# Altium footprint library hphonglib.PcbLib: 1250 footprints (part 55 of 79) (continued)
## QFP64E-Pitch_0.5mm [mm] "64-Pin Thin Quad Flat Pack 10x10x1mm body, 0.5 mm Pitch, IPC High Density" (continued)
Top Overlay:
  circle w0.25: c-5.525,4.425 r0.125
  lines w0.2: -6.4,-6.4 6.4,-6.4 6.4,6.4 -4.395,6.4 -6.4,4.395 -6.4,-6.4
  lines w0.203: -16.51,-16.51 16.51,-16.51 16.51,16.51 -16.51,16.51 -16.51,-16.51
  text "1" at -11.43,10.16 h1.02
  text "17" at -10.16,-12.065 h1.02
  text "33" at 12.065,-10.16 h1.02
  text "49" at 10.16,12.065 h1.02
Mechanical 13:
  circle w0.1: c-4.1,4.1 r0.5
  lines w0.1: -5,-5 -5,5 5,5 5,-5 -5,-5
Mechanical 15:
  lines w0.1: -0.5,0 0.5,0 ; 0,-0.5 0,0.5 ; -6.4,-6.4 6.4,-6.4 6.4,6.4 -6.4,6.4 -6.4,-6.4
3D body: height 1.6, standoff 0, extent -5,-5 5,5

## QFP80.MSP430FG439 [mm] "80-Pin Thin Quad Flat Pack 0.5 mm Pitch, IPC Low Density"
pads (80):
  rect 1.2x0.25 smd: 1(0,0)
  oval 1.2x0.25 smd: 2(0,-0.5) 3(0,-1) 4(0,-1.5) 5(0,-2) 6(0,-2.5) 7(0,-3) 8(0,-3.5) 9(0,-4) 10(0,-4.5) 11(0,-5) 12(0,-5.5) 13(0,-6) 14(0,-6.5) 15(0,-7) 16(0,-7.5) 17(0,-8) 18(0,-8.5) 19(0,-9) 20(0,-9.5) 41(14,-9.5) 42(14,-9) 43(14,-8.5) 44(14,-8) 45(14,-7.5) 46(14,-7) 47(14,-6.5) 48(14,-6) 49(14,-5.5) 50(14,-5) 51(14,-4.5) 52(14,-4) 53(14,-3.5) 54(14,-3) 55(14,-2.5) 56(14,-2) 57(14,-1.5) 58(14,-1) 59(14,-0.5) 60(14,0)
  oval 0.25x1.2 smd: 21(2.25,-11.75) 22(2.75,-11.75) 23(3.25,-11.75) 24(3.75,-11.75) 25(4.25,-11.75) 26(4.75,-11.75) 27(5.25,-11.75) 28(5.75,-11.75) 29(6.25,-11.75) 30(6.75,-11.75) 31(7.25,-11.75) 32(7.75,-11.75) 33(8.25,-11.75) 34(8.75,-11.75) 35(9.25,-11.75) 36(9.75,-11.75) 37(10.25,-11.75) 38(10.75,-11.75) 39(11.25,-11.75) 40(11.75,-11.75) 61(11.75,2.25) 62(11.25,2.25) 63(10.75,2.25) 64(10.25,2.25) 65(9.75,2.25) 66(9.25,2.25) 67(8.75,2.25) 68(8.25,2.25) 69(7.75,2.25) 70(7.25,2.25) 71(6.75,2.25) 72(6.25,2.25) 73(5.75,2.25) 74(5.25,2.25) 75(4.75,2.25) 76(4.25,2.25) 77(3.75,2.25) 78(3.25,2.25) 79(2.75,2.25) 80(2.25,2.25)
Top Overlay:
  lines w0.2: 1.135,-10.615 12.865,-10.615 12.865,1.115 2.27,1.115 1.135,-0.02 1.135,-10.615
Mechanical 13:
  lines w0.2: -0.75,-12.5 -0.75,3 14.75,3 14.75,-12.5 -0.75,-12.5
  text ".Designator" at 3.531,-5.182 h2.03
3D body: height 1.57, standoff 1.55, extent 7.674,-3.58 8.174,-3.08
3D body: height 1.57, standoff 1.55, extent 7.25,-5.775 8.135,-3.813
3D body: height 1.57, standoff 1.55, extent 3.8,-7.588 9.95,-2.1
3D body: height 0.2, standoff 0, extent 0,-0.125 1.025,0.125
3D body: height 1.55, standoff 0.1, extent 1,-10.737 13,1.262
3D body: height 0.2, standoff 0, extent 0,-0.625 1.025,-0.375
3D body: height 0.2, standoff 0, extent 0,-1.125 1.025,-0.875
3D body: height 0.2, standoff 0, extent 0,-1.625 1.025,-1.375
3D body: height 0.2, standoff 0, extent 0,-2.125 1.025,-1.875
3D body: height 0.2, standoff 0, extent 0,-2.625 1.025,-2.375
3D body: height 0.2, standoff 0, extent 0,-3.125 1.025,-2.875
3D body: height 0.2, standoff 0, extent 0,-3.625 1.025,-3.375
3D body: height 0.2, standoff 0, extent 0,-4.125 1.025,-3.875
3D body: height 0.2, standoff 0, extent 0,-4.625 1.025,-4.375
3D body: height 0.2, standoff 0, extent 0,-5.15 1.025,-4.9
3D body: height 0.2, standoff 0, extent 0,-5.625 1.025,-5.375
3D body: height 0.2, standoff 0, extent 0,-6.125 1.025,-5.875
3D body: height 0.2, standoff 0, extent 0,-6.625 1.025,-6.375
3D body: height 0.2, standoff 0, extent 0,-7.125 1.025,-6.875
3D body: height 0.2, standoff 0, extent 0,-7.625 1.025,-7.375
3D body: height 0.2, standoff 0, extent 0,-8.125 1.025,-7.875
3D body: height 0.2, standoff 0, extent 0,-8.625 1.025,-8.375
3D body: height 0.2, standoff 0, extent 0,-9.125 1.025,-8.875
3D body: height 0.2, standoff 0, extent 0,-9.625 1.025,-9.375
3D body: height 0.2, standoff 0, extent 12.975,-9.625 14,-9.375
3D body: height 0.2, standoff 0, extent 12.975,-9.125 14,-8.875
3D body: height 0.2, standoff 0, extent 12.975,-8.625 14,-8.375
3D body: height 0.2, standoff 0, extent 12.975,-8.125 14,-7.875
3D body: height 0.2, standoff 0, extent 12.975,-7.625 14,-7.375
3D body: height 0.2, standoff 0, extent 12.975,-7.125 14,-6.875
3D body: height 0.2, standoff 0, extent 12.975,-6.625 14,-6.375
3D body: height 0.2, standoff 0, extent 12.975,-6.125 14,-5.875
3D body: height 0.2, standoff 0, extent 12.975,-5.625 14,-5.375
3D body: height 0.2, standoff 0, extent 12.975,-5.125 14,-4.875
3D body: height 0.2, standoff 0, extent 12.975,-4.625 14,-4.375
3D body: height 0.2, standoff 0, extent 12.975,-4.125 14,-3.875
3D body: height 0.2, standoff 0, extent 12.975,-3.625 14,-3.375
3D body: height 0.2, standoff 0, extent 12.975,-3.125 14,-2.875
3D body: height 0.2, standoff 0, extent 12.975,-2.625 14,-2.375
3D body: height 0.2, standoff 0, extent 12.975,-2.125 14,-1.875
3D body: height 0.2, standoff 0, extent 12.975,-1.625 14,-1.375
3D body: height 0.2, standoff 0, extent 12.975,-1.125 14,-0.875
3D body: height 0.2, standoff 0, extent 12.975,-0.625 14,-0.375
3D body: height 0.2, standoff 0, extent 12.975,-0.125 14,0.125
3D body: height 0.2, standoff 0, extent 11.625,1.225 11.875,2.25
3D body: height 0.2, standoff 0, extent 11.125,1.225 11.375,2.25
3D body: height 0.2, standoff 0, extent 10.625,1.225 10.875,2.25
3D body: height 0.2, standoff 0, extent 10.125,1.225 10.375,2.25
3D body: height 0.2, standoff 0, extent 9.625,1.225 9.875,2.25
3D body: height 0.2, standoff 0, extent 9.125,1.225 9.375,2.25
3D body: height 0.2, standoff 0, extent 8.625,1.225 8.875,2.25
3D body: height 0.2, standoff 0, extent 8.125,1.225 8.375,2.25
3D body: height 0.2, standoff 0, extent 7.625,1.225 7.875,2.25
3D body: height 0.2, standoff 0, extent 7.125,1.225 7.375,2.25
3D body: height 0.2, standoff 0, extent 6.625,1.225 6.875,2.25
3D body: height 0.2, standoff 0, extent 6.125,1.225 6.375,2.25
3D body: height 0.2, standoff 0, extent 5.625,1.225 5.875,2.25
3D body: height 0.2, standoff 0, extent 5.125,1.225 5.375,2.25
3D body: height 0.2, standoff 0, extent 4.625,1.225 4.875,2.25
3D body: height 0.2, standoff 0, extent 4.125,1.225 4.375,2.25
3D body: height 0.2, standoff 0, extent 3.625,1.225 3.875,2.25
3D body: height 0.2, standoff 0, extent 3.125,1.225 3.375,2.25
3D body: height 0.2, standoff 0, extent 2.625,1.225 2.875,2.25
3D body: height 0.2, standoff 0, extent 2.125,1.225 2.375,2.25
3D body: height 0.2, standoff 0, extent 2.125,-11.75 2.375,-10.725
3D body: height 0.2, standoff 0, extent 2.625,-11.75 2.875,-10.725
3D body: height 0.2, standoff 0, extent 3.125,-11.75 3.375,-10.725
3D body: height 0.2, standoff 0, extent 3.625,-11.75 3.875,-10.725
3D body: height 0.2, standoff 0, extent 4.125,-11.75 4.375,-10.725
3D body: height 0.2, standoff 0, extent 4.625,-11.75 4.875,-10.725
3D body: height 0.2, standoff 0, extent 5.125,-11.75 5.375,-10.725
3D body: height 0.2, standoff 0, extent 5.625,-11.75 5.875,-10.725
3D body: height 0.2, standoff 0, extent 6.125,-11.75 6.375,-10.725
3D body: height 0.2, standoff 0, extent 6.625,-11.75 6.875,-10.725
3D body: height 0.2, standoff 0, extent 7.125,-11.75 7.375,-10.725
3D body: height 0.2, standoff 0, extent 7.625,-11.75 7.875,-10.725
3D body: height 0.2, standoff 0, extent 8.125,-11.75 8.375,-10.725
3D body: height 0.2, standoff 0, extent 8.625,-11.75 8.875,-10.725
3D body: height 0.2, standoff 0, extent 9.125,-11.75 9.375,-10.725
3D body: height 0.2, standoff 0, extent 9.625,-11.75 9.875,-10.725
3D body: height 0.2, standoff 0, extent 10.125,-11.75 10.375,-10.725
3D body: height 0.2, standoff 0, extent 10.625,-11.75 10.875,-10.725
3D body: height 0.2, standoff 0, extent 11.125,-11.75 11.375,-10.725
3D body: height 0.2, standoff 0, extent 11.625,-11.75 11.875,-10.725
3D body: height 1.57, standoff 1.55, extent 1.35,-0.1 2.35,0.9

## QFP80EN [mm] "80-Pin Thin Quad Flat Pack 0.5 mm Pitch, 12x12x1mm Body"
pads (164):
  round 5 hole 3: 0(16.51,16.51) 1(16.51,-16.51) 2(-16.51,-16.51) 3(-16.51,16.51)
  rect 1.5x1.5 hole 0.9: 1(-13.97,11.43) 21(-11.43,-13.97) 41(13.97,-11.43) 61(11.43,13.97)
  rect 1.2x0.25 smd: 1(-7,4.75)
  round 1.5 hole 0.9: 2(-16.51,11.43) 3(-13.97,8.89) 4(-16.51,8.89) 5(-13.97,6.35) 6(-16.51,6.35) 7(-13.97,3.81) 8(-16.51,3.81) 9(-13.97,1.27) 10(-16.51,1.27) 11(-13.97,-1.27) 12(-16.51,-1.27) 13(-13.97,-3.81) 14(-16.51,-3.81) 15(-13.97,-6.35) 16(-16.51,-6.35) 17(-13.97,-8.81) 18(-16.51,-8.81) 19(-13.97,-11.43) 20(-16.51,-11.43) 22(-11.43,-16.51) 23(-8.89,-13.97) 24(-8.89,-16.51) 25(-6.35,-13.97) 26(-6.35,-16.51) 27(-3.81,-13.97) 28(-3.81,-16.51) 29(-1.27,-13.97) 30(-1.27,-16.51) 31(1.27,-13.97) 32(1.27,-16.51) 33(3.81,-13.97) 34(3.81,-16.51) 35(6.35,-13.97) 36(6.35,-16.51) 37(8.81,-13.97) 38(8.81,-16.51) 39(11.43,-13.97) 40(11.43,-16.51) 42(16.51,-11.43) 43(13.97,-8.89) 44(16.51,-8.89) 45(13.97,-6.35) 46(16.51,-6.35) 47(13.97,-3.81) 48(16.51,-3.81) 49(13.97,-1.27) 50(16.51,-1.27) 51(13.97,1.27) 52(16.51,1.27) 53(13.97,3.81) 54(16.51,3.81) 55(13.97,6.35) 56(16.51,6.35) 57(13.97,8.81) 58(16.51,8.81) 59(13.97,11.43) 60(16.51,11.43) 62(11.43,16.51) 63(8.89,13.97) 64(8.89,16.51) 65(6.35,13.97) 66(6.35,16.51) 67(3.81,13.97) 68(3.81,16.51) 69(1.27,13.97) 70(1.27,16.51) 71(-1.27,13.97) 72(-1.27,16.51) 73(-3.81,13.97) 74(-3.81,16.51) 75(-6.35,13.97) 76(-6.35,16.51) 77(-8.81,13.97) 78(-8.81,16.51) 79(-11.43,13.97) 80(-11.43,16.51)
  oval 1.2x0.25 smd: 2(-7,4.25) 3(-7,3.75) 4(-7,3.25) 5(-7,2.75) 6(-7,2.25) 7(-7,1.75) 8(-7,1.25) 9(-7,0.75) 10(-7,0.25) 11(-7,-0.25) 12(-7,-0.75) 13(-7,-1.25) 14(-7,-1.75) 15(-7,-2.25) 16(-7,-2.75) 17(-7,-3.25) 18(-7,-3.75) 19(-7,-4.25) 20(-7,-4.75) 41(7,-4.75) 42(7,-4.25) 43(7,-3.75) 44(7,-3.25) 45(7,-2.75) 46(7,-2.25) 47(7,-1.75) 48(7,-1.25) 49(7,-0.75) 50(7,-0.25) 51(7,0.25) 52(7,0.75) 53(7,1.25) 54(7,1.75) 55(7,2.25) 56(7,2.75) 57(7,3.25) 58(7,3.75) 59(7,4.25) 60(7,4.75)
  oval 0.25x1.2 smd: 21(-4.75,-7) 22(-4.25,-7) 23(-3.75,-7) 24(-3.25,-7) 25(-2.75,-7) 26(-2.25,-7) 27(-1.75,-7) 28(-1.25,-7) 29(-0.75,-7) 30(-0.25,-7) 31(0.25,-7) 32(0.75,-7) 33(1.25,-7) 34(1.75,-7) 35(2.25,-7) 36(2.75,-7) 37(3.25,-7) 38(3.75,-7) 39(4.25,-7) 40(4.75,-7) 61(4.75,7) 62(4.25,7) 63(3.75,7) 64(3.25,7) 65(2.75,7) 66(2.25,7) 67(1.75,7) 68(1.25,7) 69(0.75,7) 70(0.25,7) 71(-0.25,7) 72(-0.75,7) 73(-1.25,7) 74(-1.75,7) 75(-2.25,7) 76(-2.75,7) 77(-3.25,7) 78(-3.75,7) 79(-4.25,7) 80(-4.75,7)
Top Layer:
  lines w0.254: -16.51,-11.43 -14.986,-12.954 -13.462,-12.954 -8.636,-8.128 -8.636,-5.842 -7.544,-4.75 -7,-4.75 ; -16.51,-8.81 -15.16,-10.16 -13.081,-10.16 -9.906,-6.985 -9.906,-5.08 -8.576,-3.75 -7,-3.75 -7.56,-3.75 ; -16.51,-6.35 -15.24,-7.62 -12.827,-7.62 -11.176,-5.969 -11.176,-4.445 -9.481,-2.75 -9.271,-2.75 -7,-2.75 ; -16.51,-3.81 -15.24,-5.08 -13.208,-5.08 -12.954,-5.08 -12.446,-4.572 -12.446,-3.683 -10.513,-1.75 -9.878,-1.75 -7,-1.75 ; -16.51,-1.27 -15.24,-2.54 -13.335,-2.54 -11.545,-0.75 -7,-0.75 ; -16.51,1.27 -15.24,0 -12.954,0 -12.704,0.25 -7,0.25 ; -16.51,3.81 -15.24,2.54 -13.081,2.54 -11.791,1.25 -7,1.25 ; -16.51,6.35 -15.24,5.08 -13.335,5.08 -10.505,2.25 -7,2.25 ; -16.51,8.89 -15.24,7.62 -13.081,7.62 -11.811,6.35 -11.811,5.588 -9.473,3.25 -7,3.25 ; -16.51,11.43 -15.24,10.16 -12.954,10.16 -10.287,7.493 -10.287,6.35 -8.187,4.25 -7,4.25 ; -13.97,-11.43 -13.208,-11.43 -9.271,-7.493 -9.271,-5.461 -8.06,-4.25 -7,-4.25 ; -13.97,-8.81 -13.001,-8.81 -10.541,-6.35 -10.541,-4.826 -8.965,-3.25 -8.838,-3.25 -7,-3.25 ; -13.97,-6.35 -12.827,-6.35 -11.811,-5.334 -11.811,-4.064 -9.997,-2.25 -9.743,-2.25 -7,-2.25 ; -13.97,-3.81 -13.589,-3.81 -11.029,-1.25 -7,-1.25 ; -13.97,-1.27 -13.081,-1.27 -12.061,-0.25 -7,-0.25 ; -13.97,1.27 -13.45,0.75 -7,0.75 ; -13.97,3.81 -13.081,3.81 -11.021,1.75 -7,1.75 ; -13.97,6.35 -12.954,6.35 -12.446,5.842 -12.446,5.207 -9.989,2.75 -7,2.75 ; -13.97,8.89 -12.954,8.89 -11.049,6.985 -11.049,5.969 -8.83,3.75 -7,3.75 ; -13.97,11.43 -12.954,11.43 -9.652,8.128 -9.652,6.604 -7.798,4.75 -7,4.75 ; -11.43,-16.51 -10.16,-15.24 -10.16,-12.954 -6.985,-9.779 -5.334,-9.779 -4.25,-8.695 -4.25,-7 ; -11.43,-13.97 -11.43,-13.208 -7.112,-8.89 -5.385,-8.89 -4.75,-8.255 -4.75,-7 ; -11.43,13.97 -11.43,13.081 -7.874,9.525 -5.461,9.525 -4.25,8.314 -4.25,7 ; -11.43,16.51 -12.7,15.24 -12.7,13.208 -9.652,10.16 -8.382,8.89 -5.639,8.89 -4.75,8.001 -4.75,7 ; -8.89,-16.51 -7.62,-15.24 -7.62,-12.573 -6.477,-11.43 -5.08,-11.43 -3.25,-9.6 -3.25,-7 ; -8.89,-13.97 -8.89,-12.7 -6.731,-10.541 -5.207,-10.541 -3.75,-9.084 -3.75,-7 ; -8.81,13.97 -8.81,12.62 -8.255,12.065 -6.86,10.67 -5.082,10.67 -3.25,8.838 -3.25,7 ; -8.81,16.51 -10.16,15.16 -10.16,12.954 -7.366,10.16 -5.334,10.16 -3.75,8.576 -3.75,7 ; -6.35,-16.51 -5.08,-15.24 -5.08,-13.208 -2.25,-10.378 -2.25,-7 ; -6.35,-13.97 -6.35,-12.7 -5.715,-12.065 -4.826,-12.065 -2.75,-9.989 -2.75,-7 ; -6.35,13.97 -6.35,12.446 -5.842,11.938 -4.572,11.938 -2.25,9.616 -2.25,7 ; -6.35,16.51 -7.62,15.24 -7.62,12.573 -6.35,11.303 -4.826,11.303 -2.75,9.227 -2.75,7 ; -3.81,-16.51 -2.54,-15.24 -2.54,-12.827 -1.25,-11.537 -1.25,-7 ; -3.81,-13.97 -3.81,-12.954 -1.75,-10.894 -1.75,-7 ; -3.81,13.97 -3.81,12.954 -1.25,10.394 -1.25,7 ; -3.81,16.51 -5.08,15.24 -5.08,13.081 -4.572,12.573 -4.318,12.573 -1.75,10.005 -1.75,7 ; -1.27,-16.51 0,-15.24 0,-12.065 -0.25,-11.815 -0.25,-7 ; -1.27,-13.97 -0.75,-13.45 -0.75,-7 ; -1.27,13.97 -1.27,12.192 -0.25,11.172 -0.25,7 ; -1.27,16.51 -2.54,15.24 -2.54,12.573 -0.75,10.783 -0.75,7 ; 0.25,-7 0.25,-11.299 1.27,-12.319 1.27,-13.97 ; 0.25,7 0.25,11.815 0,12.065 0,15.24 1.27,16.51 ; 0.75,-7 0.75,-10.91 2.54,-12.7 2.54,-15.24 1.27,-16.51 ; 0.75,7 0.75,12.434 1.27,12.954 1.27,13.97 ; 1.25,-7 1.25,-10.521 3.81,-13.081 3.81,-13.97 ; 1.25,7 1.25,11.791 2.54,13.081 2.54,15.24 3.81,16.51 ; 1.75,-7 1.75,-10.132 5.08,-13.462 5.08,-15.24 3.81,-16.51 ; 1.75,7 1.75,11.275 3.81,13.335 3.81,13.97 ; 2.25,-7 2.25,-9.616 6.35,-13.716 6.35,-13.97 ; 2.25,7 2.25,10.886 3.429,12.065 4.318,12.065 5.08,12.827 5.08,15.24 6.35,16.51 ; 2.75,-7 2.75,-9.227 5.653,-12.13 6.923,-12.13 7.62,-12.827 7.62,-15.24 6.35,-16.51 ; 2.75,7 2.75,10.37 3.81,11.43 4.572,11.43 6.35,13.208 6.35,13.97 ; 3.25,-7 3.25,-8.838 5.715,-11.303 7.366,-11.303 8.81,-12.747 8.81,-13.97 ; 3.25,7 3.25,9.854 4.191,10.795 5.207,10.795 7.62,13.208 7.62,15.24 8.89,16.51 ; 3.75,-7 3.75,-8.449 5.715,-10.414 7.493,-10.414 10.16,-13.081 10.16,-15.16 8.81,-16.51 ; 3.75,7 3.75,9.211 4.699,10.16 5.842,10.16 8.89,13.208 8.89,13.97 ; 4.25,-7 4.25,-8.06 5.842,-9.652 7.874,-9.652 11.43,-13.208 ; 4.25,7 4.25,8.441 5.461,9.652 5.969,9.652 6.731,9.652 10.137,13.058 10.137,15.217 11.43,16.51 11.43,15.875 ; 4.75,-7 4.75,-7.747 6.02,-9.017 8.382,-9.017 12.7,-13.335 12.7,-15.24 11.43,-16.51 ; 4.75,7 4.75,7.925 5.715,8.89 7.112,8.89 11.43,13.208 11.43,13.97 11.811,13.97 ; 7,-4.75 8.179,-4.75 8.909,-5.48 8.909,-7.385 11.176,-9.652 12.954,-11.43 13.97,-11.43 ; 7,-4.25 8.568,-4.25 9.525,-5.207 9.525,-6.731 12.954,-10.16 15.24,-10.16 16.51,-11.43 ; 7,-3.75 8.957,-3.75 10.16,-4.953 10.287,-5.08 10.287,-6.35 12.827,-8.89 13.97,-8.89 ; 7,-3.25 9.346,-3.25 10.922,-4.826 10.922,-5.969 12.573,-7.62 15.748,-7.62 16.51,-8.382 16.51,-8.89 ; 7,-2.75 9.735,-2.75 10.922,-3.937 11.684,-4.699 11.684,-5.588 12.446,-6.35 13.97,-6.35 ; 7,-2.25 10.251,-2.25 12.319,-4.318 12.319,-4.572 12.827,-5.08 15.367,-5.08 16.51,-6.223 16.51,-6.35 ; 7,-1.75 10.894,-1.75 12.954,-3.81 13.97,-3.81 ; 7,-1.25 11.41,-1.25 12.7,-2.54 15.24,-2.54 16.51,-3.81 ; 7,-0.75 11.926,-0.75 12.446,-1.27 13.97,-1.27 ; 7,-0.25 12.831,-0.25 13.081,0 15.24,0 16.51,-1.27 ; 7,0.25 12.061,0.25 13.208,1.397 13.843,1.397 ; 7,0.75 11.418,0.75 13.208,2.54 15.24,2.54 16.51,1.27 ; 7,1.25 11.029,1.25 13.589,3.81 13.97,3.81 ; 7,1.75 10.513,1.75 12.446,3.683 12.446,4.318 13.208,5.08 15.24,5.08 16.51,3.81 ; 7,2.25 10.124,2.25 11.811,3.937 11.811,5.461 12.7,6.35 13.97,6.35 ; 7,2.75 9.735,2.75 11.176,4.191 11.176,5.842 12.954,7.62 15.24,7.62 16.51,6.35 ; 7,3.25 9.219,3.25 10.541,4.572 10.541,6.223 13.128,8.81 13.97,8.81 ; 7,3.75 8.83,3.75 9.906,4.826 9.906,6.858 13.208,10.16 15.367,10.16 16.51,9.017 16.51,8.81 ; 7,4.25 8.441,4.25 9.271,5.08 9.271,7.366 13.335,11.43 13.97,11.43 ; 7,4.75 7.925,4.75 8.636,5.461 8.636,8.001 13.335,12.7 15.24,12.7 16.51,11.43
Top Overlay:
  circle w0.25: c-6.856,5.588 r0.125
  lines w0.2: -7.874,5.461 -7.874,-7.874 7.874,-7.874 7.874,7.874 -5.4,7.874
  lines w0.203: -7.874,5.461 -5.461,7.874 -5.4,7.874 ; -19.05,-19.05 19.05,-19.05 19.05,19.05 -19.05,19.05 -19.05,-19.05
  text "1" at -14.097,12.573 h1.02
  text "21" at -12.446,-14.732 h1.02
  text "41" at 14.732,-12.446 h1.02
  text "61" at 12.573,14.605 h1.02
Mechanical 13:
  circle w0.1: c-4.923,5.009 r0.5
  lines w0.2: -5.969,-5.969 -5.969,5.969 5.969,5.969 5.969,-5.969 -5.969,-5.969
  text ".Designator" at -3.469,-0.432 h2.03
3D body "TQFP-80.STEP": height 1.1, standoff 0.04, extent -7,-7 7,7
3D body: height 1.57, standoff 1.55, extent 0.674,1.17 1.174,1.67
3D body: height 1.57, standoff 1.55, extent 0.25,-1.025 1.135,0.937
3D body: height 1.57, standoff 1.55, extent -3.2,-2.838 2.95,2.65

## QFP80N [mm] "80-Pin Thin Quad Flat Pack 0.5 mm Pitch, IPC Low Density"
pads (80):
  rect 1.2x0.25 smd: 1(0,0)
  oval 1.2x0.25 smd: 2(0,-0.5) 3(0,-1) 4(0,-1.5) 5(0,-2) 6(0,-2.5) 7(0,-3) 8(0,-3.5) 9(0,-4) 10(0,-4.5) 11(0,-5) 12(0,-5.5) 13(0,-6) 14(0,-6.5) 15(0,-7) 16(0,-7.5) 17(0,-8) 18(0,-8.5) 19(0,-9) 20(0,-9.5) 41(14,-9.5) 42(14,-9) 43(14,-8.5) 44(14,-8) 45(14,-7.5) 46(14,-7) 47(14,-6.5) 48(14,-6) 49(14,-5.5) 50(14,-5) 51(14,-4.5) 52(14,-4) 53(14,-3.5) 54(14,-3) 55(14,-2.5) 56(14,-2) 57(14,-1.5) 58(14,-1) 59(14,-0.5) 60(14,0)
  oval 0.25x1.2 smd: 21(2.25,-11.75) 22(2.75,-11.75) 23(3.25,-11.75) 24(3.75,-11.75) 25(4.25,-11.75) 26(4.75,-11.75) 27(5.25,-11.75) 28(5.75,-11.75) 29(6.25,-11.75) 30(6.75,-11.75) 31(7.25,-11.75) 32(7.75,-11.75) 33(8.25,-11.75) 34(8.75,-11.75) 35(9.25,-11.75) 36(9.75,-11.75) 37(10.25,-11.75) 38(10.75,-11.75) 39(11.25,-11.75) 40(11.75,-11.75) 61(11.75,2.25) 62(11.25,2.25) 63(10.75,2.25) 64(10.25,2.25) 65(9.75,2.25) 66(9.25,2.25) 67(8.75,2.25) 68(8.25,2.25) 69(7.75,2.25) 70(7.25,2.25) 71(6.75,2.25) 72(6.25,2.25) 73(5.75,2.25) 74(5.25,2.25) 75(4.75,2.25) 76(4.25,2.25) 77(3.75,2.25) 78(3.25,2.25) 79(2.75,2.25) 80(2.25,2.25)
Top Overlay:
  lines w0.2: -0.75,-12.5 -0.75,0.52 1.73,3 14.75,3 14.75,-12.5 -0.75,-12.5
Mechanical 13:
  lines w0.2: -0.75,-12.5 14.75,-12.5 14.75,3 -0.75,3 -0.75,-12.5
  text ".Designator" at 3.531,-5.182 h2.03
3D body "TQFP-80.STEP": height 1.1, standoff 0.04, extent 0,-11.75 14,2.25
3D body: height 1.57, standoff 1.55, extent 3.8,-7.588 9.95,-2.1
3D body: height 1.57, standoff 1.55, extent 7.25,-5.775 8.135,-3.813
3D body: height 1.57, standoff 1.55, extent 7.674,-3.58 8.174,-3.08